# Altium footprint library smd-ipc.PCBLIB: 363 footprints (part 22 of 27)
Each footprint in its own frame and in the unit in brackets; x right, y up, seen from the top. Pads: shape width x height; smd on the part's side, far side on the other; paste and mask are expansions set on the pad; w line width, h text height; cw(c..) or ccw(c..) is an arc to the next point about the centre after c.
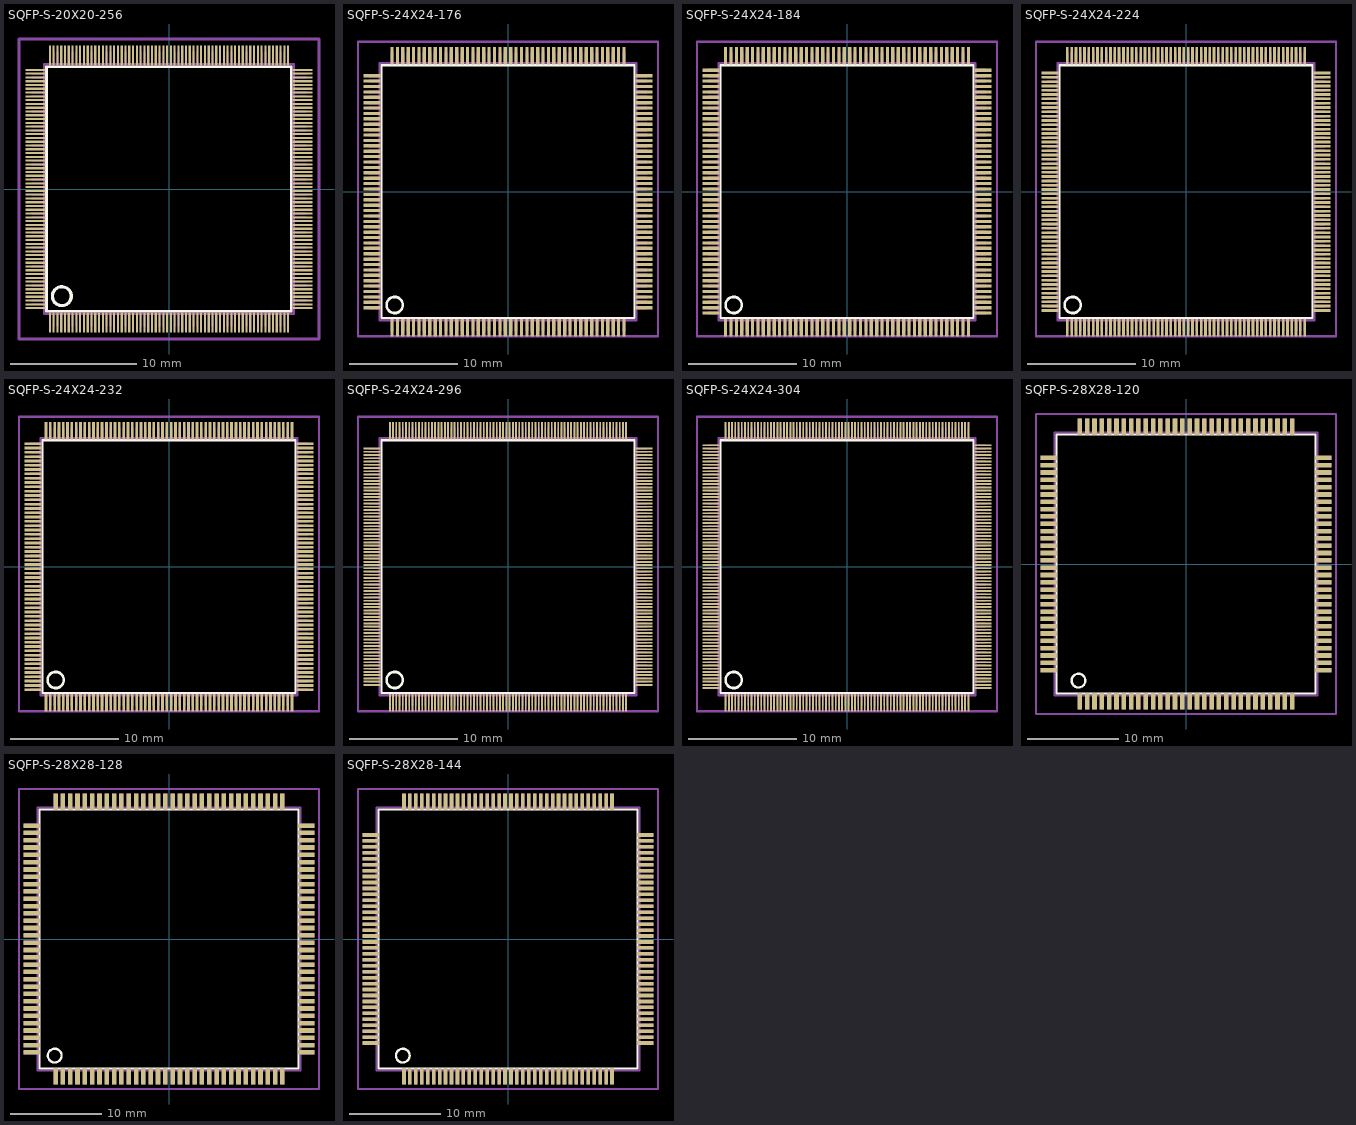
[diagram p21: the footprints below, top view; thin cyan lines are the x and y axes]

## SQFP-S-20X20-256 [mm]
pads (256):
  rect 0.17x1.6 smd: 1(-9.45,-10.6) 2(-9.15,-10.6) 3(-8.85,-10.6) 4(-8.55,-10.6) 5(-8.25,-10.6) 6(-7.95,-10.6) 7(-7.65,-10.6) 8(-7.35,-10.6) 9(-7.05,-10.6) 10(-6.75,-10.6) 11(-6.45,-10.6) 12(-6.15,-10.6) 13(-5.85,-10.6) 14(-5.55,-10.6) 15(-5.25,-10.6) 16(-4.95,-10.6) 17(-4.65,-10.6) 18(-4.35,-10.6) 19(-4.05,-10.6) 20(-3.75,-10.6) 21(-3.45,-10.6) 22(-3.15,-10.6) 23(-2.85,-10.6) 24(-2.55,-10.6) 25(-2.25,-10.6) 26(-1.95,-10.6) 27(-1.65,-10.6) 28(-1.35,-10.6) 29(-1.05,-10.6) 30(-0.75,-10.6) 31(-0.45,-10.6) 32(-0.15,-10.6) 33(0.15,-10.6) 34(0.45,-10.6) 35(0.75,-10.6) 36(1.05,-10.6) 37(1.35,-10.6) 38(1.65,-10.6) 39(1.95,-10.6) 40(2.25,-10.6) 41(2.55,-10.6) 42(2.85,-10.6) 43(3.15,-10.6) 44(3.45,-10.6) 45(3.75,-10.6) 46(4.05,-10.6) 47(4.35,-10.6) 48(4.65,-10.6) 49(4.95,-10.6) 50(5.25,-10.6) 51(5.55,-10.6) 52(5.85,-10.6) 53(6.15,-10.6) 54(6.45,-10.6) 55(6.75,-10.6) 56(7.05,-10.6) 57(7.35,-10.6) 58(7.65,-10.6) 59(7.95,-10.6) 60(8.25,-10.6) 61(8.55,-10.6) 62(8.85,-10.6) 63(9.15,-10.6) 64(9.45,-10.6) 129(9.45,10.6) 130(9.15,10.6) 131(8.85,10.6) 132(8.55,10.6) 133(8.25,10.6) 134(7.95,10.6) 135(7.65,10.6) 136(7.35,10.6) 137(7.05,10.6) 138(6.75,10.6) 139(6.45,10.6) 140(6.15,10.6) 141(5.85,10.6) 142(5.55,10.6) 143(5.25,10.6) 144(4.95,10.6) 145(4.65,10.6) 146(4.35,10.6) 147(4.05,10.6) 148(3.75,10.6) 149(3.45,10.6) 150(3.15,10.6) 151(2.85,10.6) 152(2.55,10.6) 153(2.25,10.6) 154(1.95,10.6) 155(1.65,10.6) 156(1.35,10.6) 157(1.05,10.6) 158(0.75,10.6) 159(0.45,10.6) 160(0.15,10.6) 161(-0.15,10.6) 162(-0.45,10.6) 163(-0.75,10.6) 164(-1.05,10.6) 165(-1.35,10.6) 166(-1.65,10.6) 167(-1.95,10.6) 168(-2.25,10.6) 169(-2.55,10.6) 170(-2.85,10.6) 171(-3.15,10.6) 172(-3.45,10.6) 173(-3.75,10.6) 174(-4.05,10.6) 175(-4.35,10.6) 176(-4.65,10.6) 177(-4.95,10.6) 178(-5.25,10.6) 179(-5.55,10.6) 180(-5.85,10.6) 181(-6.15,10.6) 182(-6.45,10.6) 183(-6.75,10.6) 184(-7.05,10.6) 185(-7.35,10.6) 186(-7.65,10.6) 187(-7.95,10.6) 188(-8.25,10.6) 189(-8.55,10.6) 190(-8.85,10.6) 191(-9.15,10.6) 192(-9.45,10.6)
  rect 1.6x0.17 smd: 65(10.6,-9.45) 66(10.6,-9.15) 67(10.6,-8.85) 68(10.6,-8.55) 69(10.6,-8.25) 70(10.6,-7.95) 71(10.6,-7.65) 72(10.6,-7.35) 73(10.6,-7.05) 74(10.6,-6.75) 75(10.6,-6.45) 76(10.6,-6.15) 77(10.6,-5.85) 78(10.6,-5.55) 79(10.6,-5.25) 80(10.6,-4.95) 81(10.6,-4.65) 82(10.6,-4.35) 83(10.6,-4.05) 84(10.6,-3.75) 85(10.6,-3.45) 86(10.6,-3.15) 87(10.6,-2.85) 88(10.6,-2.55) 89(10.6,-2.25) 90(10.6,-1.95) 91(10.6,-1.65) 92(10.6,-1.35) 93(10.6,-1.05) 94(10.6,-0.75) 95(10.6,-0.45) 96(10.6,-0.15) 97(10.6,0.15) 98(10.6,0.45) 99(10.6,0.75) 100(10.6,1.05) 101(10.6,1.35) 102(10.6,1.65) 103(10.6,1.95) 104(10.6,2.25) 105(10.6,2.55) 106(10.6,2.85) 107(10.6,3.15) 108(10.6,3.45) 109(10.6,3.75) 110(10.6,4.05) 111(10.6,4.35) 112(10.6,4.65) 113(10.6,4.95) 114(10.6,5.25) 115(10.6,5.55) 116(10.6,5.85) 117(10.6,6.15) 118(10.6,6.45) 119(10.6,6.75) 120(10.6,7.05) 121(10.6,7.35) 122(10.6,7.65) 123(10.6,7.95) 124(10.6,8.25) 125(10.6,8.55) 126(10.6,8.85) 127(10.6,9.15) 128(10.6,9.45) 193(-10.6,9.45) 194(-10.6,9.15) 195(-10.6,8.85) 196(-10.6,8.55) 197(-10.6,8.25) 198(-10.6,7.95) 199(-10.6,7.65) 200(-10.6,7.35) 201(-10.6,7.05) 202(-10.6,6.75) 203(-10.6,6.45) 204(-10.6,6.15) 205(-10.6,5.85) 206(-10.6,5.55) 207(-10.6,5.25) 208(-10.6,4.95) 209(-10.6,4.65) 210(-10.6,4.35) 211(-10.6,4.05) 212(-10.6,3.75) 213(-10.6,3.45) 214(-10.6,3.15) 215(-10.6,2.85) 216(-10.6,2.55) 217(-10.6,2.25) 218(-10.6,1.95) 219(-10.6,1.65) 220(-10.6,1.35) 221(-10.6,1.05) 222(-10.6,0.75) 223(-10.6,0.45) 224(-10.6,0.15) 225(-10.6,-0.15) 226(-10.6,-0.45) 227(-10.6,-0.75) 228(-10.6,-1.05) 229(-10.6,-1.35) 230(-10.6,-1.65) 231(-10.6,-1.95) 232(-10.6,-2.25) 233(-10.6,-2.55) 234(-10.6,-2.85) 235(-10.6,-3.15) 236(-10.6,-3.45) 237(-10.6,-3.75) 238(-10.6,-4.05) 239(-10.6,-4.35) 240(-10.6,-4.65) 241(-10.6,-4.95) 242(-10.6,-5.25) 243(-10.6,-5.55) 244(-10.6,-5.85) 245(-10.6,-6.15) 246(-10.6,-6.45) 247(-10.6,-6.75) 248(-10.6,-7.05) 249(-10.6,-7.35) 250(-10.6,-7.65) 251(-10.6,-7.95) 252(-10.6,-8.25) 253(-10.6,-8.55) 254(-10.6,-8.85) 255(-10.6,-9.15) 256(-10.6,-9.45)
Top Overlay:
  circle w0.254: c-8.5,-8.5 r0.75
  lines w0.203: -9.72,-9.71 9.71,-9.71 9.71,9.71 -9.72,9.71 -9.72,-9.71
Mechanical 16:
  drawing of 260 lines, arcs and shapes, not listed
Mechanical 27:
  lines w0.2: -11.9,-11.9 -11.9,11.9 11.9,11.9 11.9,-11.9 -11.9,-11.9

## SQFP-S-24X24-176 [mm]
pads (176):
  rect 0.3x1.6 smd: 1(-10.75,-12.6) 2(-10.25,-12.6) 3(-9.75,-12.6) 4(-9.25,-12.6) 5(-8.75,-12.6) 6(-8.25,-12.6) 7(-7.75,-12.6) 8(-7.25,-12.6) 9(-6.75,-12.6) 10(-6.25,-12.6) 11(-5.75,-12.6) 12(-5.25,-12.6) 13(-4.75,-12.6) 14(-4.25,-12.6) 15(-3.75,-12.6) 16(-3.25,-12.6) 17(-2.75,-12.6) 18(-2.25,-12.6) 19(-1.75,-12.6) 20(-1.25,-12.6) 21(-0.75,-12.6) 22(-0.25,-12.6) 23(0.25,-12.6) 24(0.75,-12.6) 25(1.25,-12.6) 26(1.75,-12.6) 27(2.25,-12.6) 28(2.75,-12.6) 29(3.25,-12.6) 30(3.75,-12.6) 31(4.25,-12.6) 32(4.75,-12.6) 33(5.25,-12.6) 34(5.75,-12.6) 35(6.25,-12.6) 36(6.75,-12.6) 37(7.25,-12.6) 38(7.75,-12.6) 39(8.25,-12.6) 40(8.75,-12.6) 41(9.25,-12.6) 42(9.75,-12.6) 43(10.25,-12.6) 44(10.75,-12.6) 89(10.75,12.6) 90(10.25,12.6) 91(9.75,12.6) 92(9.25,12.6) 93(8.75,12.6) 94(8.25,12.6) 95(7.75,12.6) 96(7.25,12.6) 97(6.75,12.6) 98(6.25,12.6) 99(5.75,12.6) 100(5.25,12.6) 101(4.75,12.6) 102(4.25,12.6) 103(3.75,12.6) 104(3.25,12.6) 105(2.75,12.6) 106(2.25,12.6) 107(1.75,12.6) 108(1.25,12.6) 109(0.75,12.6) 110(0.25,12.6) 111(-0.25,12.6) 112(-0.75,12.6) 113(-1.25,12.6) 114(-1.75,12.6) 115(-2.25,12.6) 116(-2.75,12.6) 117(-3.25,12.6) 118(-3.75,12.6) 119(-4.25,12.6) 120(-4.75,12.6) 121(-5.25,12.6) 122(-5.75,12.6) 123(-6.25,12.6) 124(-6.75,12.6) 125(-7.25,12.6) 126(-7.75,12.6) 127(-8.25,12.6) 128(-8.75,12.6) 129(-9.25,12.6) 130(-9.75,12.6) 131(-10.25,12.6) 132(-10.75,12.6)
  rect 1.6x0.3 smd: 45(12.6,-10.75) 46(12.6,-10.25) 47(12.6,-9.75) 48(12.6,-9.25) 49(12.6,-8.75) 50(12.6,-8.25) 51(12.6,-7.75) 52(12.6,-7.25) 53(12.6,-6.75) 54(12.6,-6.25) 55(12.6,-5.75) 56(12.6,-5.25) 57(12.6,-4.75) 58(12.6,-4.25) 59(12.6,-3.75) 60(12.6,-3.25) 61(12.6,-2.75) 62(12.6,-2.25) 63(12.6,-1.75) 64(12.6,-1.25) 65(12.6,-0.75) 66(12.6,-0.25) 67(12.6,0.25) 68(12.6,0.75) 69(12.6,1.25) 70(12.6,1.75) 71(12.6,2.25) 72(12.6,2.75) 73(12.6,3.25) 74(12.6,3.75) 75(12.6,4.25) 76(12.6,4.75) 77(12.6,5.25) 78(12.6,5.75) 79(12.6,6.25) 80(12.6,6.75) 81(12.6,7.25) 82(12.6,7.75) 83(12.6,8.25) 84(12.6,8.75) 85(12.6,9.25) 86(12.6,9.75) 87(12.6,10.25) 88(12.6,10.75) 133(-12.6,10.75) 134(-12.6,10.25) 135(-12.6,9.75) 136(-12.6,9.25) 137(-12.6,8.75) 138(-12.6,8.25) 139(-12.6,7.75) 140(-12.6,7.25) 141(-12.6,6.75) 142(-12.6,6.25) 143(-12.6,5.75) 144(-12.6,5.25) 145(-12.6,4.75) 146(-12.6,4.25) 147(-12.6,3.75) 148(-12.6,3.25) 149(-12.6,2.75) 150(-12.6,2.25) 151(-12.6,1.75) 152(-12.6,1.25) 153(-12.6,0.75) 154(-12.6,0.25) 155(-12.6,-0.25) 156(-12.6,-0.75) 157(-12.6,-1.25) 158(-12.6,-1.75) 159(-12.6,-2.25) 160(-12.6,-2.75) 161(-12.6,-3.25) 162(-12.6,-3.75) 163(-12.6,-4.25) 164(-12.6,-4.75) 165(-12.6,-5.25) 166(-12.6,-5.75) 167(-12.6,-6.25) 168(-12.6,-6.75) 169(-12.6,-7.25) 170(-12.6,-7.75) 171(-12.6,-8.25) 172(-12.6,-8.75) 173(-12.6,-9.25) 174(-12.6,-9.75) 175(-12.6,-10.25) 176(-12.6,-10.75)
Top Overlay:
  circle w0.254: c-10.5,-10.5 r0.75
  lines w0.203: -11.72,-11.71 11.71,-11.71 11.71,11.71 -11.72,11.71 -11.72,-11.71
Mechanical 16:
  drawing of 180 lines, arcs and shapes, not listed
Mechanical 27:
  lines w0.2: -13.9,-13.4 -13.9,13.9 13.9,13.9 13.9,-13.4 -13.9,-13.4

## SQFP-S-24X24-184 [mm]
pads (184):
  rect 0.3x1.6 smd: 1(-11.25,-12.6) 2(-10.75,-12.6) 3(-10.25,-12.6) 4(-9.75,-12.6) 5(-9.25,-12.6) 6(-8.75,-12.6) 7(-8.25,-12.6) 8(-7.75,-12.6) 9(-7.25,-12.6) 10(-6.75,-12.6) 11(-6.25,-12.6) 12(-5.75,-12.6) 13(-5.25,-12.6) 14(-4.75,-12.6) 15(-4.25,-12.6) 16(-3.75,-12.6) 17(-3.25,-12.6) 18(-2.75,-12.6) 19(-2.25,-12.6) 20(-1.75,-12.6) 21(-1.25,-12.6) 22(-0.75,-12.6) 23(-0.25,-12.6) 24(0.25,-12.6) 25(0.75,-12.6) 26(1.25,-12.6) 27(1.75,-12.6) 28(2.25,-12.6) 29(2.75,-12.6) 30(3.25,-12.6) 31(3.75,-12.6) 32(4.25,-12.6) 33(4.75,-12.6) 34(5.25,-12.6) 35(5.75,-12.6) 36(6.25,-12.6) 37(6.75,-12.6) 38(7.25,-12.6) 39(7.75,-12.6) 40(8.25,-12.6) 41(8.75,-12.6) 42(9.25,-12.6) 43(9.75,-12.6) 44(10.25,-12.6) 45(10.75,-12.6) 46(11.25,-12.6) 93(11.25,12.6) 94(10.75,12.6) 95(10.25,12.6) 96(9.75,12.6) 97(9.25,12.6) 98(8.75,12.6) 99(8.25,12.6) 100(7.75,12.6) 101(7.25,12.6) 102(6.75,12.6) 103(6.25,12.6) 104(5.75,12.6) 105(5.25,12.6) 106(4.75,12.6) 107(4.25,12.6) 108(3.75,12.6) 109(3.25,12.6) 110(2.75,12.6) 111(2.25,12.6) 112(1.75,12.6) 113(1.25,12.6) 114(0.75,12.6) 115(0.25,12.6) 116(-0.25,12.6) 117(-0.75,12.6) 118(-1.25,12.6) 119(-1.75,12.6) 120(-2.25,12.6) 121(-2.75,12.6) 122(-3.25,12.6) 123(-3.75,12.6) 124(-4.25,12.6) 125(-4.75,12.6) 126(-5.25,12.6) 127(-5.75,12.6) 128(-6.25,12.6) 129(-6.75,12.6) 130(-7.25,12.6) 131(-7.75,12.6) 132(-8.25,12.6) 133(-8.75,12.6) 134(-9.25,12.6) 135(-9.75,12.6) 136(-10.25,12.6) 137(-10.75,12.6) 138(-11.25,12.6)
  rect 1.6x0.3 smd: 47(12.6,-11.25) 48(12.6,-10.75) 49(12.6,-10.25) 50(12.6,-9.75) 51(12.6,-9.25) 52(12.6,-8.75) 53(12.6,-8.25) 54(12.6,-7.75) 55(12.6,-7.25) 56(12.6,-6.75) 57(12.6,-6.25) 58(12.6,-5.75) 59(12.6,-5.25) 60(12.6,-4.75) 61(12.6,-4.25) 62(12.6,-3.75) 63(12.6,-3.25) 64(12.6,-2.75) 65(12.6,-2.25) 66(12.6,-1.75) 67(12.6,-1.25) 68(12.6,-0.75) 69(12.6,-0.25) 70(12.6,0.25) 71(12.6,0.75) 72(12.6,1.25) 73(12.6,1.75) 74(12.6,2.25) 75(12.6,2.75) 76(12.6,3.25) 77(12.6,3.75) 78(12.6,4.25) 79(12.6,4.75) 80(12.6,5.25) 81(12.6,5.75) 82(12.6,6.25) 83(12.6,6.75) 84(12.6,7.25) 85(12.6,7.75) 86(12.6,8.25) 87(12.6,8.75) 88(12.6,9.25) 89(12.6,9.75) 90(12.6,10.25) 91(12.6,10.75) 92(12.6,11.25) 139(-12.6,11.25) 140(-12.6,10.75) 141(-12.6,10.25) 142(-12.6,9.75) 143(-12.6,9.25) 144(-12.6,8.75) 145(-12.6,8.25) 146(-12.6,7.75) 147(-12.6,7.25) 148(-12.6,6.75) 149(-12.6,6.25) 150(-12.6,5.75) 151(-12.6,5.25) 152(-12.6,4.75) 153(-12.6,4.25) 154(-12.6,3.75) 155(-12.6,3.25) 156(-12.6,2.75) 157(-12.6,2.25) 158(-12.6,1.75) 159(-12.6,1.25) 160(-12.6,0.75) 161(-12.6,0.25) 162(-12.6,-0.25) 163(-12.6,-0.75) 164(-12.6,-1.25) 165(-12.6,-1.75) 166(-12.6,-2.25) 167(-12.6,-2.75) 168(-12.6,-3.25) 169(-12.6,-3.75) 170(-12.6,-4.25) 171(-12.6,-4.75) 172(-12.6,-5.25) 173(-12.6,-5.75) 174(-12.6,-6.25) 175(-12.6,-6.75) 176(-12.6,-7.25) 177(-12.6,-7.75) 178(-12.6,-8.25) 179(-12.6,-8.75) 180(-12.6,-9.25) 181(-12.6,-9.75) 182(-12.6,-10.25) 183(-12.6,-10.75) 184(-12.6,-11.25)
Top Overlay:
  circle w0.254: c-10.5,-10.5 r0.75
  lines w0.203: -11.72,-11.71 11.71,-11.71 11.71,11.71 -11.72,11.71 -11.72,-11.71
Mechanical 16:
  drawing of 188 lines, arcs and shapes, not listed
Mechanical 27:
  lines w0.2: -13.9,-13.4 -13.9,13.9 13.9,13.9 13.9,-13.4 -13.9,-13.4

## SQFP-S-24X24-224 [mm]
pads (224):
  rect 0.25x1.6 smd: 1(-11,-12.6) 2(-10.6,-12.6) 3(-10.2,-12.6) 4(-9.8,-12.6) 5(-9.4,-12.6) 6(-9,-12.6) 7(-8.6,-12.6) 8(-8.2,-12.6) 9(-7.8,-12.6) 10(-7.4,-12.6) 11(-7,-12.6) 12(-6.6,-12.6) 13(-6.2,-12.6) 14(-5.8,-12.6) 15(-5.4,-12.6) 16(-5,-12.6) 17(-4.6,-12.6) 18(-4.2,-12.6) 19(-3.8,-12.6) 20(-3.4,-12.6) 21(-3,-12.6) 22(-2.6,-12.6) 23(-2.2,-12.6) 24(-1.8,-12.6) 25(-1.4,-12.6) 26(-1,-12.6) 27(-0.6,-12.6) 28(-0.2,-12.6) 29(0.2,-12.6) 30(0.6,-12.6) 31(1,-12.6) 32(1.4,-12.6) 33(1.8,-12.6) 34(2.2,-12.6) 35(2.6,-12.6) 36(3,-12.6) 37(3.4,-12.6) 38(3.8,-12.6) 39(4.2,-12.6) 40(4.6,-12.6) 41(5,-12.6) 42(5.4,-12.6) 43(5.8,-12.6) 44(6.2,-12.6) 45(6.6,-12.6) 46(7,-12.6) 47(7.4,-12.6) 48(7.8,-12.6) 49(8.2,-12.6) 50(8.6,-12.6) 51(9,-12.6) 52(9.4,-12.6) 53(9.8,-12.6) 54(10.2,-12.6) 55(10.6,-12.6) 56(11,-12.6) 113(11,12.6) 114(10.6,12.6) 115(10.2,12.6) 116(9.8,12.6) 117(9.4,12.6) 118(9,12.6) 119(8.6,12.6) 120(8.2,12.6) 121(7.8,12.6) 122(7.4,12.6) 123(7,12.6) 124(6.6,12.6) 125(6.2,12.6) 126(5.8,12.6) 127(5.4,12.6) 128(5,12.6) 129(4.6,12.6) 130(4.2,12.6) 131(3.8,12.6) 132(3.4,12.6) 133(3,12.6) 134(2.6,12.6) 135(2.2,12.6) 136(1.8,12.6) 137(1.4,12.6) 138(1,12.6) 139(0.6,12.6) 140(0.2,12.6) 141(-0.2,12.6) 142(-0.6,12.6) 143(-1,12.6) 144(-1.4,12.6) 145(-1.8,12.6) 146(-2.2,12.6) 147(-2.6,12.6) 148(-3,12.6) 149(-3.4,12.6) 150(-3.8,12.6) 151(-4.2,12.6) 152(-4.6,12.6) 153(-5,12.6) 154(-5.4,12.6) 155(-5.8,12.6) 156(-6.2,12.6) 157(-6.6,12.6) 158(-7,12.6) 159(-7.4,12.6) 160(-7.8,12.6) 161(-8.2,12.6) 162(-8.6,12.6) 163(-9,12.6) 164(-9.4,12.6) 165(-9.8,12.6) 166(-10.2,12.6) 167(-10.6,12.6) 168(-11,12.6)
  rect 1.6x0.25 smd: 57(12.6,-11) 58(12.6,-10.6) 59(12.6,-10.2) 60(12.6,-9.8) 61(12.6,-9.4) 62(12.6,-9) 63(12.6,-8.6) 64(12.6,-8.2) 65(12.6,-7.8) 66(12.6,-7.4) 67(12.6,-7) 68(12.6,-6.6) 69(12.6,-6.2) 70(12.6,-5.8) 71(12.6,-5.4) 72(12.6,-5) 73(12.6,-4.6) 74(12.6,-4.2) 75(12.6,-3.8) 76(12.6,-3.4) 77(12.6,-3) 78(12.6,-2.6) 79(12.6,-2.2) 80(12.6,-1.8) 81(12.6,-1.4) 82(12.6,-1) 83(12.6,-0.6) 84(12.6,-0.2) 85(12.6,0.2) 86(12.6,0.6) 87(12.6,1) 88(12.6,1.4) 89(12.6,1.8) 90(12.6,2.2) 91(12.6,2.6) 92(12.6,3) 93(12.6,3.4) 94(12.6,3.8) 95(12.6,4.2) 96(12.6,4.6) 97(12.6,5) 98(12.6,5.4) 99(12.6,5.8) 100(12.6,6.2) 101(12.6,6.6) 102(12.6,7) 103(12.6,7.4) 104(12.6,7.8) 105(12.6,8.2) 106(12.6,8.6) 107(12.6,9) 108(12.6,9.4) 109(12.6,9.8) 110(12.6,10.2) 111(12.6,10.6) 112(12.6,11) 169(-12.6,11) 170(-12.6,10.6) 171(-12.6,10.2) 172(-12.6,9.8) 173(-12.6,9.4) 174(-12.6,9) 175(-12.6,8.6) 176(-12.6,8.2) 177(-12.6,7.8) 178(-12.6,7.4) 179(-12.6,7) 180(-12.6,6.6) 181(-12.6,6.2) 182(-12.6,5.8) 183(-12.6,5.4) 184(-12.6,5) 185(-12.6,4.6) 186(-12.6,4.2) 187(-12.6,3.8) 188(-12.6,3.4) 189(-12.6,3) 190(-12.6,2.6) 191(-12.6,2.2) 192(-12.6,1.8) 193(-12.6,1.4) 194(-12.6,1) 195(-12.6,0.6) 196(-12.6,0.2) 197(-12.6,-0.2) 198(-12.6,-0.6) 199(-12.6,-1) 200(-12.6,-1.4) 201(-12.6,-1.8) 202(-12.6,-2.2) 203(-12.6,-2.6) 204(-12.6,-3) 205(-12.6,-3.4) 206(-12.6,-3.8) 207(-12.6,-4.2) 208(-12.6,-4.6) 209(-12.6,-5) 210(-12.6,-5.4) 211(-12.6,-5.8) 212(-12.6,-6.2) 213(-12.6,-6.6) 214(-12.6,-7) 215(-12.6,-7.4) 216(-12.6,-7.8) 217(-12.6,-8.2) 218(-12.6,-8.6) 219(-12.6,-9) 220(-12.6,-9.4) 221(-12.6,-9.8) 222(-12.6,-10.2) 223(-12.6,-10.6) 224(-12.6,-11)
Top Overlay:
  circle w0.254: c-10.5,-10.5 r0.75
  lines w0.203: -11.72,-11.71 11.71,-11.71 11.71,11.71 -11.72,11.71 -11.72,-11.71
Mechanical 16:
  drawing of 228 lines, arcs and shapes, not listed
Mechanical 27:
  lines w0.2: -13.9,-13.4 -13.9,13.9 13.9,13.9 13.9,-13.4 -13.9,-13.4

## SQFP-S-24X24-232 [mm]
pads (232):
  rect 0.25x1.6 smd: 1(-11.4,-12.6) 2(-11,-12.6) 3(-10.6,-12.6) 4(-10.2,-12.6) 5(-9.8,-12.6) 6(-9.4,-12.6) 7(-9,-12.6) 8(-8.6,-12.6) 9(-8.2,-12.6) 10(-7.8,-12.6) 11(-7.4,-12.6) 12(-7,-12.6) 13(-6.6,-12.6) 14(-6.2,-12.6) 15(-5.8,-12.6) 16(-5.4,-12.6) 17(-5,-12.6) 18(-4.6,-12.6) 19(-4.2,-12.6) 20(-3.8,-12.6) 21(-3.4,-12.6) 22(-3,-12.6) 23(-2.6,-12.6) 24(-2.2,-12.6) 25(-1.8,-12.6) 26(-1.4,-12.6) 27(-1,-12.6) 28(-0.6,-12.6) 29(-0.2,-12.6) 30(0.2,-12.6) 31(0.6,-12.6) 32(1,-12.6) 33(1.4,-12.6) 34(1.8,-12.6) 35(2.2,-12.6) 36(2.6,-12.6) 37(3,-12.6) 38(3.4,-12.6) 39(3.8,-12.6) 40(4.2,-12.6) 41(4.6,-12.6) 42(5,-12.6) 43(5.4,-12.6) 44(5.8,-12.6) 45(6.2,-12.6) 46(6.6,-12.6) 47(7,-12.6) 48(7.4,-12.6) 49(7.8,-12.6) 50(8.2,-12.6) 51(8.6,-12.6) 52(9,-12.6) 53(9.4,-12.6) 54(9.8,-12.6) 55(10.2,-12.6) 56(10.6,-12.6) 57(11,-12.6) 58(11.4,-12.6) 117(11.4,12.6) 118(11,12.6) 119(10.6,12.6) 120(10.2,12.6) 121(9.8,12.6) 122(9.4,12.6) 123(9,12.6) 124(8.6,12.6) 125(8.2,12.6) 126(7.8,12.6) 127(7.4,12.6) 128(7,12.6) 129(6.6,12.6) 130(6.2,12.6) 131(5.8,12.6) 132(5.4,12.6) 133(5,12.6) 134(4.6,12.6) 135(4.2,12.6) 136(3.8,12.6) 137(3.4,12.6) 138(3,12.6) 139(2.6,12.6) 140(2.2,12.6) 141(1.8,12.6) 142(1.4,12.6) 143(1,12.6) 144(0.6,12.6) 145(0.2,12.6) 146(-0.2,12.6) 147(-0.6,12.6) 148(-1,12.6) 149(-1.4,12.6) 150(-1.8,12.6) 151(-2.2,12.6) 152(-2.6,12.6) 153(-3,12.6) 154(-3.4,12.6) 155(-3.8,12.6) 156(-4.2,12.6) 157(-4.6,12.6) 158(-5,12.6) 159(-5.4,12.6) 160(-5.8,12.6) 161(-6.2,12.6) 162(-6.6,12.6) 163(-7,12.6) 164(-7.4,12.6) 165(-7.8,12.6) 166(-8.2,12.6) 167(-8.6,12.6) 168(-9,12.6) 169(-9.4,12.6) 170(-9.8,12.6) 171(-10.2,12.6) 172(-10.6,12.6) 173(-11,12.6) 174(-11.4,12.6)
  rect 1.6x0.25 smd: 59(12.6,-11.4) 60(12.6,-11) 61(12.6,-10.6) 62(12.6,-10.2) 63(12.6,-9.8) 64(12.6,-9.4) 65(12.6,-9) 66(12.6,-8.6) 67(12.6,-8.2) 68(12.6,-7.8) 69(12.6,-7.4) 70(12.6,-7) 71(12.6,-6.6) 72(12.6,-6.2) 73(12.6,-5.8) 74(12.6,-5.4) 75(12.6,-5) 76(12.6,-4.6) 77(12.6,-4.2) 78(12.6,-3.8) 79(12.6,-3.4) 80(12.6,-3) 81(12.6,-2.6) 82(12.6,-2.2) 83(12.6,-1.8) 84(12.6,-1.4) 85(12.6,-1) 86(12.6,-0.6) 87(12.6,-0.2) 88(12.6,0.2) 89(12.6,0.6) 90(12.6,1) 91(12.6,1.4) 92(12.6,1.8) 93(12.6,2.2) 94(12.6,2.6) 95(12.6,3) 96(12.6,3.4) 97(12.6,3.8) 98(12.6,4.2) 99(12.6,4.6) 100(12.6,5) 101(12.6,5.4) 102(12.6,5.8) 103(12.6,6.2) 104(12.6,6.6) 105(12.6,7) 106(12.6,7.4) 107(12.6,7.8) 108(12.6,8.2) 109(12.6,8.6) 110(12.6,9) 111(12.6,9.4) 112(12.6,9.8) 113(12.6,10.2) 114(12.6,10.6) 115(12.6,11) 116(12.6,11.4) 175(-12.6,11.4) 176(-12.6,11) 177(-12.6,10.6) 178(-12.6,10.2) 179(-12.6,9.8) 180(-12.6,9.4) 181(-12.6,9) 182(-12.6,8.6) 183(-12.6,8.2) 184(-12.6,7.8) 185(-12.6,7.4) 186(-12.6,7) 187(-12.6,6.6) 188(-12.6,6.2) 189(-12.6,5.8) 190(-12.6,5.4) 191(-12.6,5) 192(-12.6,4.6) 193(-12.6,4.2) 194(-12.6,3.8) 195(-12.6,3.4) 196(-12.6,3) 197(-12.6,2.6) 198(-12.6,2.2) 199(-12.6,1.8) 200(-12.6,1.4) 201(-12.6,1) 202(-12.6,0.6) 203(-12.6,0.2) 204(-12.6,-0.2) 205(-12.6,-0.6) 206(-12.6,-1) 207(-12.6,-1.4) 208(-12.6,-1.8) 209(-12.6,-2.2) 210(-12.6,-2.6) 211(-12.6,-3) 212(-12.6,-3.4) 213(-12.6,-3.8) 214(-12.6,-4.2) 215(-12.6,-4.6) 216(-12.6,-5) 217(-12.6,-5.4) 218(-12.6,-5.8) 219(-12.6,-6.2) 220(-12.6,-6.6) 221(-12.6,-7) 222(-12.6,-7.4) 223(-12.6,-7.8) 224(-12.6,-8.2) 225(-12.6,-8.6) 226(-12.6,-9) 227(-12.6,-9.4) 228(-12.6,-9.8) 229(-12.6,-10.2) 230(-12.6,-10.6) 231(-12.6,-11) 232(-12.6,-11.4)
Top Overlay:
  circle w0.254: c-10.5,-10.5 r0.75
  lines w0.203: -11.72,-11.71 11.71,-11.71 11.71,11.71 -11.72,11.71 -11.72,-11.71
Mechanical 16:
  drawing of 236 lines, arcs and shapes, not listed
Mechanical 27:
  lines w0.2: -13.9,-13.4 -13.9,13.9 13.9,13.9 13.9,-13.4 -13.9,-13.4

## SQFP-S-24X24-296 [mm]
pads (296):
  rect 0.17x1.6 smd: 1(-10.95,-12.6) 2(-10.65,-12.6) 3(-10.35,-12.6) 4(-10.05,-12.6) 5(-9.75,-12.6) 6(-9.45,-12.6) 7(-9.15,-12.6) 8(-8.85,-12.6) 9(-8.55,-12.6) 10(-8.25,-12.6) 11(-7.95,-12.6) 12(-7.65,-12.6) 13(-7.35,-12.6) 14(-7.05,-12.6) 15(-6.75,-12.6) 16(-6.45,-12.6) 17(-6.15,-12.6) 18(-5.85,-12.6) 19(-5.55,-12.6) 20(-5.25,-12.6) 21(-4.95,-12.6) 22(-4.65,-12.6) 23(-4.35,-12.6) 24(-4.05,-12.6) 25(-3.75,-12.6) 26(-3.45,-12.6) 27(-3.15,-12.6) 28(-2.85,-12.6) 29(-2.55,-12.6) 30(-2.25,-12.6) 31(-1.95,-12.6) 32(-1.65,-12.6) 33(-1.35,-12.6) 34(-1.05,-12.6) 35(-0.75,-12.6) 36(-0.45,-12.6) 37(-0.15,-12.6) 38(0.15,-12.6) 39(0.45,-12.6) 40(0.75,-12.6) 41(1.05,-12.6) 42(1.35,-12.6) 43(1.65,-12.6) 44(1.95,-12.6) 45(2.25,-12.6) 46(2.55,-12.6) 47(2.85,-12.6) 48(3.15,-12.6) 49(3.45,-12.6) 50(3.75,-12.6) 51(4.05,-12.6) 52(4.35,-12.6) 53(4.65,-12.6) 54(4.95,-12.6) 55(5.25,-12.6) 56(5.55,-12.6) 57(5.85,-12.6) 58(6.15,-12.6) 59(6.45,-12.6) 60(6.75,-12.6) 61(7.05,-12.6) 62(7.35,-12.6) 63(7.65,-12.6) 64(7.95,-12.6) 65(8.25,-12.6) 66(8.55,-12.6) 67(8.85,-12.6) 68(9.15,-12.6) 69(9.45,-12.6) 70(9.75,-12.6) 71(10.05,-12.6) 72(10.35,-12.6) 73(10.65,-12.6) 74(10.95,-12.6) 149(10.95,12.6) 150(10.65,12.6) 151(10.35,12.6) 152(10.05,12.6) 153(9.75,12.6) 154(9.45,12.6) 155(9.15,12.6) 156(8.85,12.6) 157(8.55,12.6) 158(8.25,12.6) 159(7.95,12.6) 160(7.65,12.6) 161(7.35,12.6) 162(7.05,12.6) 163(6.75,12.6) 164(6.45,12.6) 165(6.15,12.6) 166(5.85,12.6) 167(5.55,12.6) 168(5.25,12.6) 169(4.95,12.6) 170(4.65,12.6) 171(4.35,12.6) 172(4.05,12.6) 173(3.75,12.6) 174(3.45,12.6) 175(3.15,12.6) 176(2.85,12.6) 177(2.55,12.6) 178(2.25,12.6) 179(1.95,12.6) 180(1.65,12.6) 181(1.35,12.6) 182(1.05,12.6) 183(0.75,12.6) 184(0.45,12.6) 185(0.15,12.6) 186(-0.15,12.6) 187(-0.45,12.6) 188(-0.75,12.6) 189(-1.05,12.6) 190(-1.35,12.6) 191(-1.65,12.6) 192(-1.95,12.6) 193(-2.25,12.6) 194(-2.55,12.6) 195(-2.85,12.6) 196(-3.15,12.6) 197(-3.45,12.6) 198(-3.75,12.6) 199(-4.05,12.6) 200(-4.35,12.6) 201(-4.65,12.6) 202(-4.95,12.6) 203(-5.25,12.6) 204(-5.55,12.6) 205(-5.85,12.6) 206(-6.15,12.6) 207(-6.45,12.6) 208(-6.75,12.6) 209(-7.05,12.6) 210(-7.35,12.6) 211(-7.65,12.6) 212(-7.95,12.6) 213(-8.25,12.6) 214(-8.55,12.6) 215(-8.85,12.6) 216(-9.15,12.6) 217(-9.45,12.6) 218(-9.75,12.6) 219(-10.05,12.6) 220(-10.35,12.6) 221(-10.65,12.6) 222(-10.95,12.6)
  rect 1.6x0.17 smd: 75(12.6,-10.95) 76(12.6,-10.65) 77(12.6,-10.35) 78(12.6,-10.05) 79(12.6,-9.75) 80(12.6,-9.45) 81(12.6,-9.15) 82(12.6,-8.85) 83(12.6,-8.55) 84(12.6,-8.25) 85(12.6,-7.95) 86(12.6,-7.65) 87(12.6,-7.35) 88(12.6,-7.05) 89(12.6,-6.75) 90(12.6,-6.45) 91(12.6,-6.15) 92(12.6,-5.85) 93(12.6,-5.55) 94(12.6,-5.25) 95(12.6,-4.95) 96(12.6,-4.65) 97(12.6,-4.35) 98(12.6,-4.05) 99(12.6,-3.75) 100(12.6,-3.45) 101(12.6,-3.15) 102(12.6,-2.85) 103(12.6,-2.55) 104(12.6,-2.25) 105(12.6,-1.95) 106(12.6,-1.65) 107(12.6,-1.35) 108(12.6,-1.05) 109(12.6,-0.75) 110(12.6,-0.45) 111(12.6,-0.15) 112(12.6,0.15) 113(12.6,0.45) 114(12.6,0.75) 115(12.6,1.05) 116(12.6,1.35) 117(12.6,1.65) 118(12.6,1.95) 119(12.6,2.25) 120(12.6,2.55) 121(12.6,2.85) 122(12.6,3.15) 123(12.6,3.45) 124(12.6,3.75) 125(12.6,4.05) 126(12.6,4.35) 127(12.6,4.65) 128(12.6,4.95) 129(12.6,5.25) 130(12.6,5.55) 131(12.6,5.85) 132(12.6,6.15) 133(12.6,6.45) 134(12.6,6.75) 135(12.6,7.05) 136(12.6,7.35) 137(12.6,7.65) 138(12.6,7.95) 139(12.6,8.25) 140(12.6,8.55) 141(12.6,8.85) 142(12.6,9.15) 143(12.6,9.45) 144(12.6,9.75) 145(12.6,10.05) 146(12.6,10.35) 147(12.6,10.65) 148(12.6,10.95) 223(-12.6,10.95) 224(-12.6,10.65) 225(-12.6,10.35) 226(-12.6,10.05) 227(-12.6,9.75) 228(-12.6,9.45) 229(-12.6,9.15) 230(-12.6,8.85) 231(-12.6,8.55) 232(-12.6,8.25) 233(-12.6,7.95) 234(-12.6,7.65) 235(-12.6,7.35) 236(-12.6,7.05) 237(-12.6,6.75) 238(-12.6,6.45) 239(-12.6,6.15) 240(-12.6,5.85) 241(-12.6,5.55) 242(-12.6,5.25) 243(-12.6,4.95) 244(-12.6,4.65) 245(-12.6,4.35) 246(-12.6,4.05) 247(-12.6,3.75) 248(-12.6,3.45) 249(-12.6,3.15) 250(-12.6,2.85) 251(-12.6,2.55) 252(-12.6,2.25) 253(-12.6,1.95) 254(-12.6,1.65) 255(-12.6,1.35) 256(-12.6,1.05) 257(-12.6,0.75) 258(-12.6,0.45) 259(-12.6,0.15) 260(-12.6,-0.15) 261(-12.6,-0.45) 262(-12.6,-0.75) 263(-12.6,-1.05) 264(-12.6,-1.35) 265(-12.6,-1.65) 266(-12.6,-1.95) 267(-12.6,-2.25) 268(-12.6,-2.55) 269(-12.6,-2.85) 270(-12.6,-3.15) 271(-12.6,-3.45) 272(-12.6,-3.75) 273(-12.6,-4.05) 274(-12.6,-4.35) 275(-12.6,-4.65) 276(-12.6,-4.95) 277(-12.6,-5.25) 278(-12.6,-5.55) 279(-12.6,-5.85) 280(-12.6,-6.15) 281(-12.6,-6.45) 282(-12.6,-6.75) 283(-12.6,-7.05) 284(-12.6,-7.35) 285(-12.6,-7.65) 286(-12.6,-7.95) 287(-12.6,-8.25) 288(-12.6,-8.55) 289(-12.6,-8.85) 290(-12.6,-9.15) 291(-12.6,-9.45) 292(-12.6,-9.75) 293(-12.6,-10.05) 294(-12.6,-10.35) 295(-12.6,-10.65) 296(-12.6,-10.95)
Top Overlay:
  circle w0.254: c-10.5,-10.5 r0.75
  lines w0.203: -11.72,-11.71 11.71,-11.71 11.71,11.71 -11.72,11.71 -11.72,-11.71
Mechanical 16:
  drawing of 300 lines, arcs and shapes, not listed